# Altium footprint library surface.PcbLib: 97 footprints (part 1 of 7)
Each footprint in its own frame and in the unit in brackets; x right, y up, seen from the top. Pads: shape width x height; smd on the part's side, far side on the other; paste and mask are expansions set on the pad; w line width, h text height; cw(c..) or ccw(c..) is an arc to the next point about the centre after c.
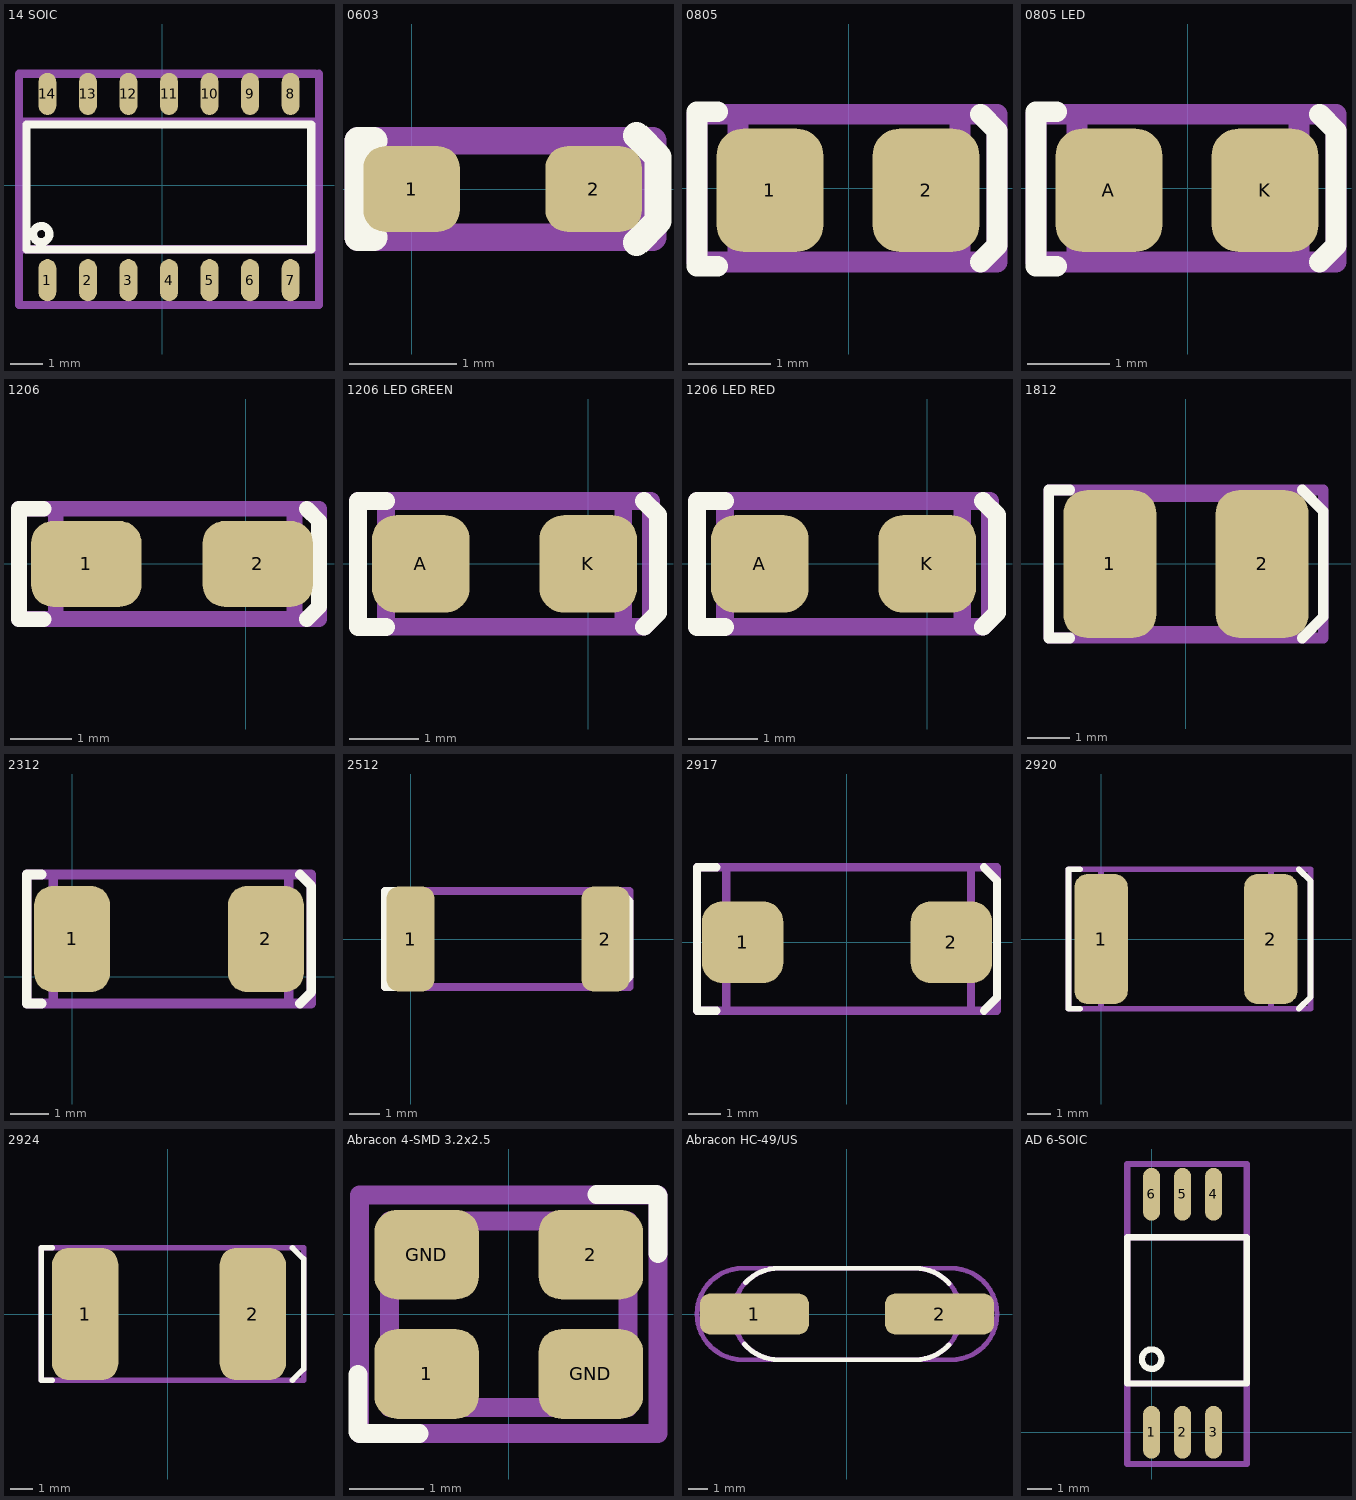
[diagram p0: the footprints below, top view; thin cyan lines are the x and y axes]

## 14 SOIC [mil]
pads (14):
  oval 22x52 smd: 1(-141.46,-116.85) 2(-91.46,-116.85) 3(-41.46,-116.85) 4(8.54,-116.85) 5(58.54,-116.85) 6(108.54,-116.85) 7(158.54,-116.85) 8(158.54,112.87) 9(108.54,112.87) 10(58.54,112.87) 11(8.54,112.87) 12(-41.46,112.87) 13(-91.46,112.87) 14(-141.46,112.87)
Top Overlay:
  circle w10: c-149,-60 r10
  lines w10: -167,-79 184,-79 184,75 -167,75 -167,-79
Mechanical 13:
  lines w10: -176.46,-78.74 193.54,-78.74 193.54,78.74 -176.46,78.74 -176.46,-78.74
Mechanical 15:
  lines w10: 188.54,137.8 -176.46,137.8 -176.46,-147.64 193.54,-147.64 193.54,137.8
3D body "D14.step": height 69.09, standoff 0, extent -163.01,-122.01 181,122.01

## 0603 [mm]
pads (2):
  rrect50% 0.9x0.8 smd: 1(0,0) 2(1.7,0)
Top Overlay:
  lines w0.254: -0.35,-0.45 -0.5,-0.45 -0.5,0.45 -0.35,0.45 ; 2.1,-0.5 2.3,-0.3 2.3,0.3 2.1,0.5
Mechanical 13:
  lines w0.254: 0,-0.45 1.75,-0.45 1.75,0.45 0,0.45 0,-0.45
Mechanical 15:
  lines w0.254: -0.5,-0.45 2.25,-0.45 2.25,0.45 -0.5,0.45 -0.5,-0.45
3D body "res_0603.stp": height 0.6, standoff 0, extent 0.05,-0.425 1.65,0.425

## 0805 [mm]
pads (2):
  rrect50% 1.3x1.5 smd: 1(-0.962,-0.026) 2(0.938,-0.026)
Top Overlay:
  lines w0.254: -1.6,-0.95 -1.85,-0.95 -1.85,0.929 -1.6,0.929 ; 1.6,-0.9 1.802,-0.698 1.802,0.698 1.6,0.9
Mechanical 13:
  lines w0.254: -1.35,-0.9 1.35,-0.9 1.35,0.9 -1.35,0.9 -1.35,-0.9
Mechanical 15:
  lines w0.254: -1.85,-0.9 -1.85,0.9 1.8,0.9 1.8,-0.9 -1.85,-0.9
3D body "0805.step": height 0.73, standoff -0.03, extent -1,-0.655 1,0.655

## 0805 LED [mm]
pads (2):
  rrect50% 1.3x1.5 smd: A(-0.962,-0.026) K(0.938,-0.026)
Top Overlay:
  lines w0.254: -1.6,-0.95 -1.85,-0.95 -1.85,0.929 -1.6,0.929 ; 1.6,-0.9 1.802,-0.698 1.802,0.698 1.6,0.9
Mechanical 13:
  lines w0.254: -1.35,-0.9 -1.35,0.9 1.35,0.9 1.35,-0.9 -1.35,-0.9
Mechanical 15:
  lines w0.254: -1.85,-0.9 1.8,-0.9 1.8,0.9 -1.85,0.9 -1.85,-0.9
3D body "LED SMD 0805.step": height 1, standoff 0, extent -1.1,-0.625 0.9,0.625

## 1206 [mm]
pads (2):
  rrect50% 1.8x1.4 smd: 1(-2.6,0) 2(0.2,0)
Top Overlay:
  lines w0.254: -3.3,-0.903 -3.7,-0.903 -3.7,0.9 -3.3,0.9 ; 1,-0.9 1.2,-0.7 1.2,0.7 1,0.9
Mechanical 13:
  lines w0.254: -3.1,-0.9 -3.1,0.9 0.8,0.9 0.8,-0.9 -3.1,-0.9
Mechanical 15:
  lines w0.254: -3.7,-0.9 -3.7,0.9 1.2,0.9 1.2,-0.9 -3.7,-0.9
3D body "F93-A.step": height 1.85, standoff 0, extent -2.902,-0.902 0.502,0.902

## 1206 LED GREEN [mm]
pads (2):
  rrect50% 1.4x1.4 smd: A(-2.4,0) K(0,0)
Top Overlay:
  lines w0.254: -2.9,-0.903 -3.3,-0.903 -3.3,0.9 -2.9,0.9 ; 0.8,-0.9 1,-0.7 1,0.7 0.8,0.9
Mechanical 13:
  lines w0.254: -2.9,-0.9 -2.9,0.9 0.5,0.9 0.5,-0.9 -2.9,-0.9
Mechanical 15:
  lines w0.254: -3.3,-0.9 -3.3,0.9 0.9,0.9 0.9,-0.8 0.8,-0.9 -3.3,-0.9
3D body "LED 1206 BLUE.STEP": height 1.1, standoff 0, extent -2.8,-0.8 0.4,0.8

## 1206 LED RED [mm]
pads (2):
  rrect50% 1.4x1.4 smd: A(-2.4,0) K(0,0)
Top Overlay:
  lines w0.254: -2.9,-0.903 -3.3,-0.903 -3.3,0.9 -2.9,0.9 ; 0.8,-0.9 1,-0.7 1,0.7 0.8,0.9
Mechanical 13:
  lines w0.254: -2.9,-0.9 0.5,-0.9 0.5,0.9 -2.9,0.9 -2.9,-0.9
Mechanical 15:
  lines w0.254: -3.3,-0.9 0.8,-0.9 0.9,-0.8 0.9,0.9 -3.3,0.9 -3.3,-0.9
3D body "LED 1206 RED.STEP": height 1.1, standoff 0, extent -2.8,-0.8 0.4,0.8

## 1812 [mm]
pads (2):
  rrect50% 2.2x3.5 smd: 1(-1.8,0) 2(1.8,0)
Top Overlay:
  lines w0.254: -2.75,-1.75 -3.25,-1.75 -3.25,1.75 -2.75,1.75 ; 2.75,-1.75 3.25,-1.25 ; 2.75,1.75 3.25,1.25 ; 3.25,-1.25 3.25,-1.25 ; 3.25,-1.25 3.25,1.25 ; 3.25,1.25 3.25,1.25
Mechanical 13:
  lines w0.254: -2.25,-1.6 -2.25,1.6 2.25,1.6 2.25,-1.6 -2.25,-1.6
Mechanical 15:
  lines w0.254: -3.25,-1.75 -3.25,1.75 3.25,1.75 3.25,-1.75 -3.25,-1.75
3D body "RLS-126-R--3DModel-STEP-1.STEP": height 2.5, standoff -0.1, extent -2.25,-1.6 2.25,1.6

## 2312 [mm]
pads (2):
  rrect50% 2x2.8 smd: 1(0,1) 2(5.1,1)
Top Overlay:
  lines w0.254: -0.8,-0.7 -1.2,-0.7 -1.2,2.7 -0.8,2.7 ; 6,-0.7 6.3,-0.4 ; 6,2.7 6.3,2.4 6.3,-0.4 ; 6.3,-0.4 6.3,-0.4 ; 6.3,-0.4 6.3,-0.4
Mechanical 13:
  lines w0.254: -0.5,-0.7 -0.5,2.7 5.7,2.7 5.7,-0.7 -0.5,-0.7
Mechanical 15:
  lines w0.254: -1.2,-0.7 -1.2,2.7 6.3,2.7 6.3,-0.7 -1.2,-0.7
3D body "TAJC-L.step": height 2.85, standoff 0, extent -0.549,-0.702 5.649,2.702

## 2512 [mm]
pads (2):
  rrect50% 1.6x3.5 smd: 1(0,0) 2(6.5,0)
Top Overlay:
  lines w0.254: -0.25,-1.6 -0.85,-1.6 -0.85,1.6 -0.25,1.6 ; 6.95,-1.6 7.3,-1.25 7.3,1.25 ; 6.95,1.6 7.3,1.25 ; 7.3,1.25 7.3,1.25
Mechanical 13:
  lines w0.254: 0.25,-1.6 0.25,1.6 6.25,1.6 6.25,-1.6 0.25,-1.6
Mechanical 15:
  lines w0.254: -0.85,-1.6 -0.85,1.6 7.3,1.6 7.3,-1.6 -0.85,-1.6
3D body "res_2512.stp": height 0.7, standoff 0, extent 0.1,-1.6 6.4,1.6

## 2917 [mm]
pads (2):
  rrect50% 2.5x2.5 smd: 1(-3.2,0) 2(3.2,0)
Top Overlay:
  lines w0.254: -4,-2.1 -4.6,-2.1 -4.6,2.3 -4,2.3 ; 4.2,-2.1 4.6,-1.7 4.6,1.35 4.6,1.9 4.2,2.3
Mechanical 13:
  lines w0.254: -3.7,-2.1 3.8,-2.1 3.8,2.3 -3.7,2.3 -3.7,-2.1
Mechanical 15:
  lines w0.254: -4.6,-2.1 4.6,-2.1 4.6,2.3 -4.6,2.3 -4.6,-2.1
3D body "tantalum 330uF.stp": height 2.8, standoff -0.1, extent -3.75,-2 3.75,2.3

## 2920 [mm]
pads (2):
  rrect50% 2.3x5.6 smd: 1(0,0) 2(7.3,0)
Top Overlay:
  lines w0.254: -0.9,-3 -1.4,-3 -1.4,3 -0.9,3 ; 8.5,-3 9,-2.5 9,2.5 8.5,3
Mechanical 13:
  lines w0.254: 0,-3 7.3,-3 7.3,3 0,3 0,-3
Mechanical 15:
  lines w0.254: -1.4,-3 9,-3 9,3 -1.4,3 -1.4,-3
3D body "0ZCF.step": height 1.14, standoff 0, extent -0.338,-2.807 7.638,2.807

## 2924 [mm]
pads (2):
  rrect50% 3x6 smd: 1(-3.75,0) 2(3.85,0)
Top Overlay:
  lines w0.254: -5.25,-3 -5.75,-3 -5.75,3 -5.25,3 ; 5.65,-3 6.15,-2.5 6.15,2.5 5.65,3
Mechanical 13:
  lines w0.254: -3.6,-3 3.7,-3 3.7,3 -3.6,3 -3.6,-3
Mechanical 15:
  lines w0.254: -5.75,-3 6.15,-3 6.15,3 -5.75,3 -5.75,-3
3D body "0ZCF.step": height 1.14, standoff 0, extent -3.938,-2.807 4.038,2.807

## Abracon 4-SMD 3.2x2.5 [mm]
pads (4):
  rrect50% 1.4x1.2 smd: 1(-1.1,-0.8) 2(1.1,0.8) GND(-1.1,0.8) GND(1.1,-0.8)
Top Overlay:
  lines w0.254: -2.021,-0.805 -2.021,-1.579 -2,-1.6 -1.2,-1.6 ; 1.179,1.608 1.979,1.608 2,1.587 2,0.813
Mechanical 13:
  lines w0.254: -1.6,-1.25 1.6,-1.25 1.6,1.25 -1.6,1.25 -1.6,-1.25
Mechanical 15:
  lines w0.254: -2,-1.6 -2,1.6 2,1.6 2,-1.6 -2,-1.6
3D body: height 0.8, standoff 0, extent -1.6,-1.25 1.6,1.25

## Abracon HC-49/US [mm]
pads (2):
  rrect50% 5.6x2.1 smd: 1(-4.75,0) 2(4.75,0)
Top Overlay:
  lines w0.254: -5.265,-1.55 ccw(c-3.5,0) -3.5,-2.349 ; -5.204,1.618 cw(c-3.5,0) -3.5,2.349 3.5,2.35 cw(c3.5,0) 5.246,1.572 ; -3.526,-2.349 3.526,-2.349 ccw(c3.5,0) 5.237,-1.582
Mechanical 13:
  lines w0.254: -3.526,-2.349 3.526,-2.349 ; -3.5,-2.349 cw(c-3.5,0) -3.5,2.349 3.5,2.35 cw(c3.5,0) 3.5,-2.349
Mechanical 15:
  lines w0.254: -5.35,-2.349 cw(c-5.35,0) -5.35,2.35 5.35,2.35 cw(c5.35,0) 5.35,-2.349 -5.35,-2.349
3D body "ABLS.STEP": height 4.06, standoff -0.1, extent -6.35,-2.349 6.35,2.35

## AD 6-SOIC [mm]
pads (6):
  oval 0.7x2.159 smd: 1(0,0) 2(1.27,0) 3(2.54,0) 4(2.54,9.76) 5(1.27,9.76) 6(0,9.76)
Top Overlay:
  circle w0.254: c0,3 r0.4
  lines w0.254: -1,2 3.9,2 3.9,8 -1,8 -1,2
Mechanical 13:
  lines w0.254: -1,2 -1,8 3.9,8 3.9,2 -1,2
Mechanical 15:
  lines w0.254: -1,-1.3 -1,11 3.9,11 3.9,-1.3 -1,-1.3
3D body "6-soic.STEP": height 2.85, standoff 0.04, extent -1.13,-0.428 3.65,10.128